# Altium footprint library SomoPowerPackControl.PcbLib: 145 footprints (part 7 of 10)
Each footprint in its own frame and in the unit in brackets; x right, y up, seen from the top. Pads: shape width x height; smd on the part's side, far side on the other; paste and mask are expansions set on the pad; w line width, h text height; cw(c..) or ccw(c..) is an arc to the next point about the centre after c.
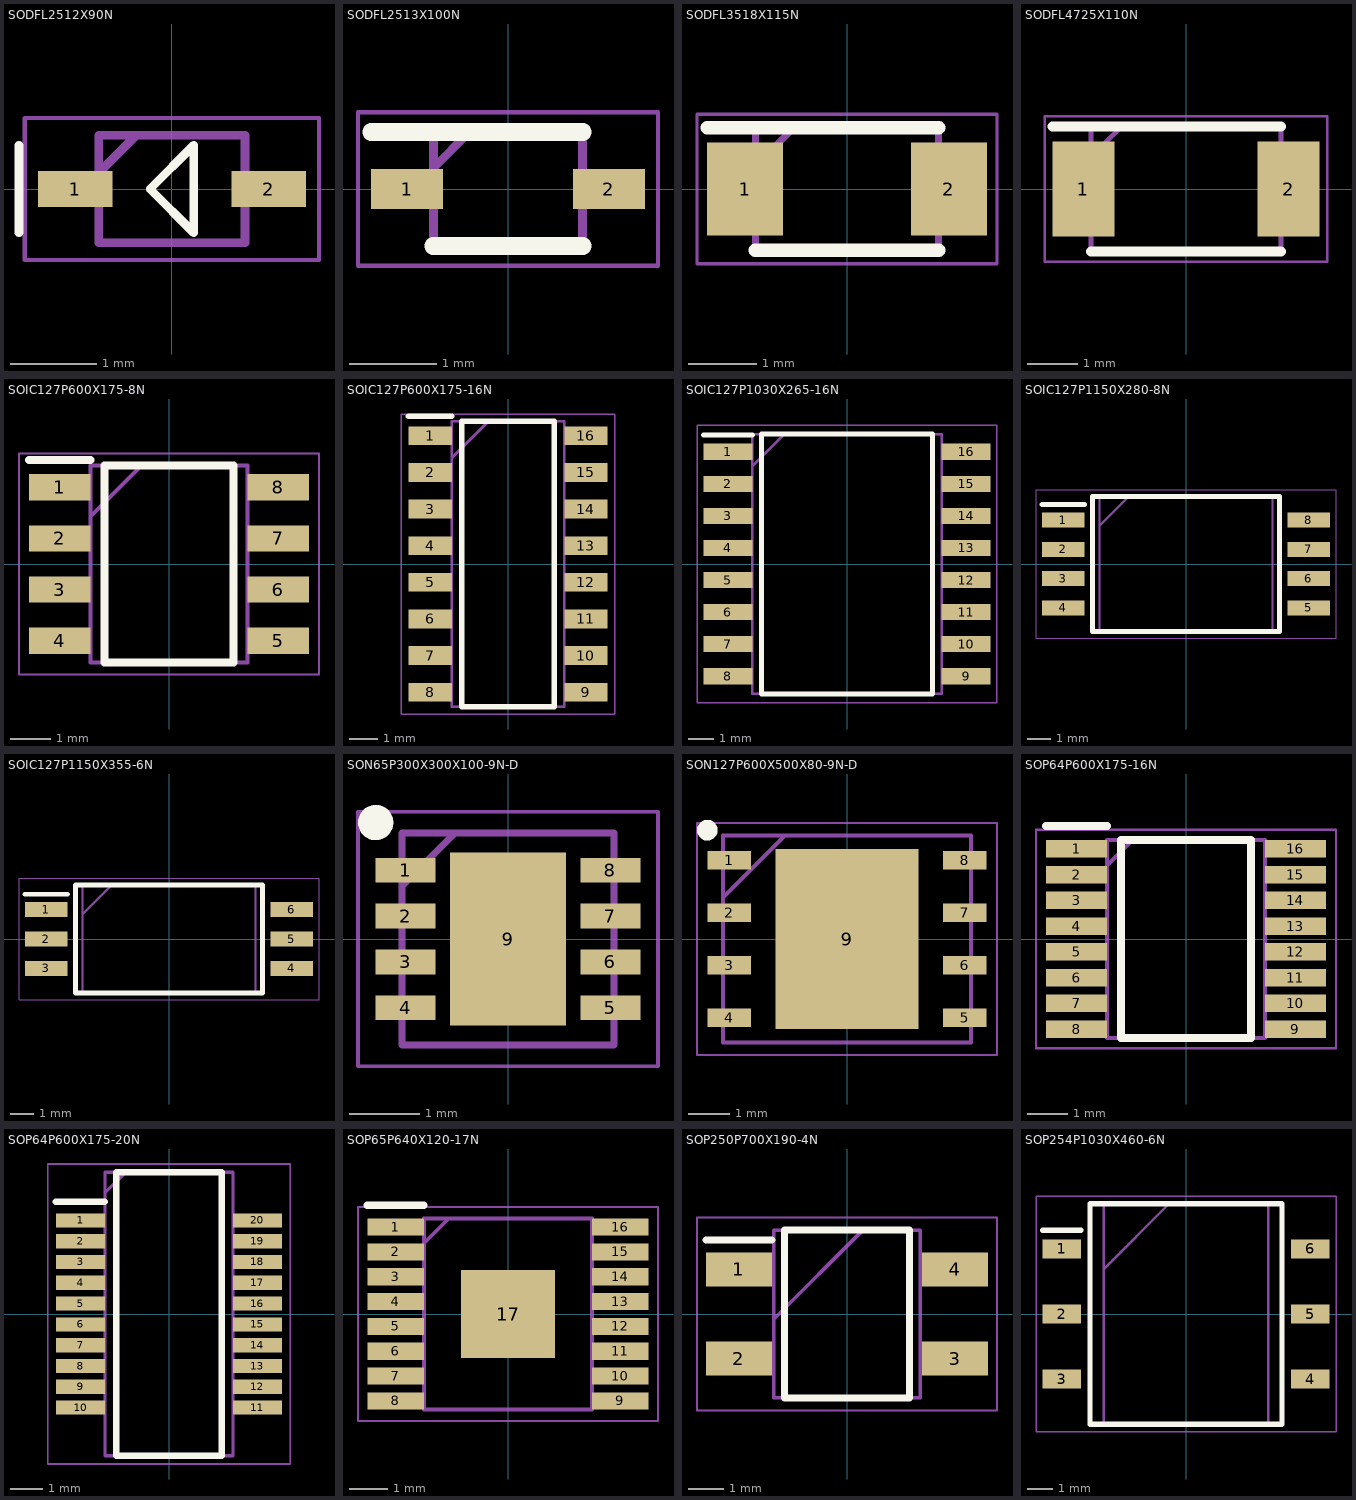
[diagram p6: the footprints below, top view; thin cyan lines are the x and y axes]

## SODFL2512X90N [mm]
pads (2):
  rect 0.87x0.42 smd: 1(-1.125,0) 2(1.125,0)
Top Overlay:
  lines w0.1: -1.778,-0.508 -1.778,0.508 ; -0.254,0 0.254,-0.508 0.254,0.508 -0.254,0
Mechanical 13:
  lines w0.1: -0.85,0.19 -0.415,0.625 ; -0.85,-0.625 0.85,-0.625 0.85,0.625 -0.85,0.625 -0.85,-0.625
Mechanical 15:
  lines w0.05: -1.71,-0.825 1.71,-0.825 1.71,0.825 -1.71,0.825 -1.71,-0.825
3D body "MM3Z12VB.stp": height 0.9, standoff 0, extent -1.25,-0.625 1.25,0.625

## SODFL2513X100N [mm]
pads (2):
  rect 0.82x0.46 smd: 1(-1.15,0) 2(1.15,0)
Top Overlay:
  lines w0.2: -1.56,0.65 0.85,0.65 ; -0.85,-0.65 0.85,-0.65
Mechanical 13:
  lines w0.1: -0.85,0.24 -0.44,0.65 ; -0.85,-0.65 0.85,-0.65 0.85,0.65 -0.85,0.65 -0.85,-0.65
Mechanical 15:
  lines w0.05: -1.71,-0.875 1.71,-0.875 1.71,0.875 -1.71,0.875 -1.71,-0.875
3D body "MM3Z15VC.stp": height 1, standoff 0, extent -1.25,-0.65 1.25,0.65

## SODFL3518X115N [mm]
pads (2):
  rect 1.12x1.37 smd: 1(-1.5,0) 2(1.5,0)
Top Overlay:
  lines w0.2: -2.06,0.9 1.35,0.9 ; -1.35,-0.9 1.35,-0.9
Mechanical 13:
  lines w0.1: -1.35,0.34 -0.79,0.9 ; -1.35,-0.9 1.35,-0.9 1.35,0.9 -1.35,0.9 -1.35,-0.9
Mechanical 15:
  lines w0.05: -2.21,-1.1 2.21,-1.1 2.21,1.1 -2.21,1.1 -2.21,-1.1
3D body "1N5819HW1-7-F.stp": height 1.15, standoff 0, extent -1.75,-0.9 1.75,0.9

## SODFL4725X110N [mm]
pads (2):
  rect 1.24x1.89 smd: 1(-2.05,0) 2(2.05,0)
Top Overlay:
  lines w0.2: -2.67,1.25 1.9,1.25 ; -1.9,-1.25 1.9,-1.25
Mechanical 13:
  lines w0.1: -1.9,0.63 -1.28,1.25 ; -1.9,-1.25 1.9,-1.25 1.9,1.25 -1.9,1.25 -1.9,-1.25
Mechanical 15:
  lines w0.05: -2.82,-1.45 2.82,-1.45 2.82,1.45 -2.82,1.45 -2.82,-1.45
3D body "GS1JAFC.stp": height 1.02, standoff 0, extent -2.349,-1.248 2.351,1.252

## SOIC127P600X175-8N [mm]
pads (8):
  rect 1.525x0.65 smd: 1(-2.712,1.905) 2(-2.712,0.635) 3(-2.712,-0.635) 4(-2.712,-1.905) 5(2.712,-1.905) 6(2.712,-0.635) 7(2.712,0.635) 8(2.712,1.905)
Top Overlay:
  lines w0.2: -3.475,2.58 -1.95,2.58 ; -1.6,-2.45 1.6,-2.45 1.6,2.45 -1.6,2.45 -1.6,-2.45
Mechanical 13:
  lines w0.1: -1.95,1.18 -0.68,2.45 ; -1.95,-2.45 1.95,-2.45 1.95,2.45 -1.95,2.45 -1.95,-2.45
Mechanical 15:
  lines w0.05: -3.725,-2.75 3.725,-2.75 3.725,2.75 -3.725,2.75 -3.725,-2.75
3D body "NE555DR.stp": height 1.75, standoff 0, extent -3,-2.45 3,2.45

## SOIC127P600X175-16N [mm]
pads (16):
  rect 1.5x0.65 smd: 1(-2.7,4.445) 2(-2.7,3.175) 3(-2.7,1.905) 4(-2.7,0.635) 5(-2.7,-0.635) 6(-2.7,-1.905) 7(-2.7,-3.175) 8(-2.7,-4.445) 9(2.7,-4.445) 10(2.7,-3.175) 11(2.7,-1.905) 12(2.7,-0.635) 13(2.7,0.635) 14(2.7,1.905) 15(2.7,3.175) 16(2.7,4.445)
Top Overlay:
  lines w0.2: -3.45,5.12 -1.95,5.12 ; -1.6,-4.95 1.6,-4.95 1.6,4.95 -1.6,4.95 -1.6,-4.95
Mechanical 13:
  lines w0.1: -1.95,3.68 -0.68,4.95 ; -1.95,-4.95 1.95,-4.95 1.95,4.95 -1.95,4.95 -1.95,-4.95
Mechanical 15:
  lines w0.05: -3.7,-5.2 3.7,-5.2 3.7,5.2 -3.7,5.2 -3.7,-5.2
3D body "Si8660BA-B-IS1.stp": height 1.75, standoff 0, extent -3,-4.95 3,4.95

## SOIC127P1030X265-16N [mm]
pads (16):
  rect 1.95x0.65 smd: 1(-4.725,4.445) 2(-4.725,3.175) 3(-4.725,1.905) 4(-4.725,0.635) 5(-4.725,-0.635) 6(-4.725,-1.905) 7(-4.725,-3.175) 8(-4.725,-4.445) 9(4.725,-4.445) 10(4.725,-3.175) 11(4.725,-1.905) 12(4.725,-0.635) 13(4.725,0.635) 14(4.725,1.905) 15(4.725,3.175) 16(4.725,4.445)
Top Overlay:
  lines w0.2: -5.7,5.12 -3.75,5.12 ; -3.4,-5.15 3.4,-5.15 3.4,5.15 -3.4,5.15 -3.4,-5.15
Mechanical 13:
  lines w0.1: -3.75,3.88 -2.48,5.15 ; -3.75,-5.15 3.75,-5.15 3.75,5.15 -3.75,5.15 -3.75,-5.15
Mechanical 15:
  lines w0.05: -5.95,-5.5 5.95,-5.5 5.95,5.5 -5.95,5.5 -5.95,-5.5
3D body "ISO1410BDWR.stp": height 2.59, standoff 0, extent -5.167,-5.15 5.167,5.15

## SOIC127P1150X280-8N [mm]
pads (8):
  rect 1.85x0.65 smd: 1(-5.325,1.905) 2(-5.325,0.635) 3(-5.325,-0.635) 4(-5.325,-1.905) 5(5.325,-1.905) 6(5.325,-0.635) 7(5.325,0.635) 8(5.325,1.905)
Top Overlay:
  lines w0.2: -6.25,2.58 -4.4,2.58 ; -4.05,-2.925 4.05,-2.925 4.05,2.925 -4.05,2.925 -4.05,-2.925
Mechanical 13:
  lines w0.1: -3.75,1.655 -2.48,2.925 ; -3.75,-2.925 3.75,-2.925 3.75,2.925 -3.75,2.925 -3.75,-2.925
Mechanical 15:
  lines w0.05: -6.5,-3.225 6.5,-3.225 6.5,3.225 -6.5,3.225 -6.5,-3.225
3D body "ISO1042BDWVR.stp": height 2.7, standoff 0, extent -5.768,-2.925 5.768,2.925

## SOIC127P1150X355-6N [mm]
pads (6):
  rect 1.85x0.65 smd: 1(-5.325,1.27) 2(-5.325,0) 3(-5.325,-1.27) 4(5.325,-1.27) 5(5.325,0) 6(5.325,1.27)
Top Overlay:
  lines w0.2: -6.25,1.945 -4.4,1.945 ; -4.05,-2.34 -4.05,2.34 4.05,2.34 4.05,-2.34 -4.05,-2.34
Mechanical 13:
  lines w0.1: -3.75,1.07 -2.48,2.34 ; -3.75,-2.34 -3.75,2.34 3.75,2.34 3.75,-2.34 -3.75,-2.34
Mechanical 15:
  lines w0.05: -6.5,-2.64 -6.5,2.64 6.5,2.64 6.5,-2.64 -6.5,-2.64

## SON65P300X300X100-9N-D [mm]
pads (9):
  rect 0.85x0.35 smd: 1(-1.45,0.975) 2(-1.45,0.325) 3(-1.45,-0.325) 4(-1.45,-0.975) 5(1.45,-0.975) 6(1.45,-0.325) 7(1.45,0.325) 8(1.45,0.975)
  rect 1.65x2.45 smd: 9(0,0)
Top Overlay:
  circle w0.25: c-1.875,1.65 r0.125
Mechanical 13:
  lines w0.1: -1.5,0.75 -0.75,1.5 ; -1.5,-1.5 -1.5,1.5 1.5,1.5 1.5,-1.5 -1.5,-1.5
Mechanical 15:
  lines w0.05: -2.125,-1.8 -2.125,1.8 2.125,1.8 2.125,-1.8 -2.125,-1.8
3D body "TJA1051TK_3_2Z.stp": height 1, standoff 0, extent -1.55,-1.5 1.55,1.5

## SON127P600X500X80-9N-D [mm]
pads (9):
  rect 1.05x0.45 smd: 1(-2.85,1.905) 2(-2.85,0.635) 3(-2.85,-0.635) 4(-2.85,-1.905) 5(2.85,-1.905) 6(2.85,-0.635) 7(2.85,0.635) 8(2.85,1.905)
  rect 3.45x4.35 smd: 9(0,0)
Top Overlay:
  circle w0.25: c-3.375,2.63 r0.125
Mechanical 13:
  lines w0.1: -3,1 -1.5,2.5 ; -3,-2.5 3,-2.5 3,2.5 -3,2.5 -3,-2.5
Mechanical 15:
  lines w0.05: -3.625,-2.8 3.625,-2.8 3.625,2.8 -3.625,2.8 -3.625,-2.8
3D body "W25Q32RVZPJM.stp": height 0.8, standoff 0, extent -3.05,-2.5 3.05,2.5

## SOP64P600X175-16N [mm]
pads (16):
  rect 1.5x0.435 smd: 1(-2.7,2.222) 2(-2.7,1.588) 3(-2.7,0.952) 4(-2.7,0.318) 5(-2.7,-0.318) 6(-2.7,-0.952) 7(-2.7,-1.588) 8(-2.7,-2.222) 9(2.7,-2.222) 10(2.7,-1.588) 11(2.7,-0.952) 12(2.7,-0.318) 13(2.7,0.318) 14(2.7,0.952) 15(2.7,1.588) 16(2.7,2.222)
Top Overlay:
  lines w0.2: -3.45,2.79 -1.95,2.79 ; -1.6,-2.445 1.6,-2.445 1.6,2.445 -1.6,2.445 -1.6,-2.445
Mechanical 13:
  lines w0.1: -1.95,1.81 -1.315,2.445 ; -1.95,-2.445 1.95,-2.445 1.95,2.445 -1.95,2.445 -1.95,-2.445
Mechanical 15:
  lines w0.05: -3.7,-2.695 3.7,-2.695 3.7,2.695 -3.7,2.695 -3.7,-2.695
3D body "SI8642BA-B-IUR.stp": height 1.75, standoff 0, extent -3,-2.445 3,2.445

## SOP64P600X175-20N [mm]
pads (20):
  rect 1.495x0.435 smd: 1(-2.702,2.858) 2(-2.702,2.222) 3(-2.702,1.588) 4(-2.702,0.952) 5(-2.702,0.318) 6(-2.702,-0.318) 7(-2.702,-0.952) 8(-2.702,-1.588) 9(-2.702,-2.222) 10(-2.702,-2.858) 11(2.702,-2.858) 12(2.702,-2.222) 13(2.702,-1.588) 14(2.702,-0.952) 15(2.702,-0.318) 16(2.702,0.318) 17(2.702,0.952) 18(2.702,1.588) 19(2.702,2.222) 20(2.702,2.858)
Top Overlay:
  lines w0.2: -3.45,3.425 -1.955,3.425 ; -1.605,-4.33 -1.605,4.33 1.605,4.33 1.605,-4.33 -1.605,-4.33
Mechanical 13:
  lines w0.1: -1.955,3.695 -1.32,4.33 ; -1.955,-4.33 -1.955,4.33 1.955,4.33 1.955,-4.33 -1.955,-4.33
Mechanical 15:
  lines w0.05: -3.7,-4.58 -3.7,4.58 3.7,4.58 3.7,-4.58 -3.7,-4.58
3D body "SI8380P-IUR.stp": height 1.75, standoff 0, extent -3,-4.33 3,4.33

## SOP65P640X120-17N [mm]
pads (17):
  rect 1.475x0.45 smd: 1(-2.938,2.275) 2(-2.938,1.625) 3(-2.938,0.975) 4(-2.938,0.325) 5(-2.938,-0.325) 6(-2.938,-0.975) 7(-2.938,-1.625) 8(-2.938,-2.275) 9(2.938,-2.275) 10(2.938,-1.625) 11(2.938,-0.975) 12(2.938,-0.325) 13(2.938,0.325) 14(2.938,0.975) 15(2.938,1.625) 16(2.938,2.275)
  rect 2.46x2.31 smd: 17(0,0)
Top Overlay:
  lines w0.2: -3.675,2.85 -2.2,2.85
Mechanical 13:
  lines w0.1: -2.2,1.85 -1.55,2.5 ; -2.2,-2.5 2.2,-2.5 2.2,2.5 -2.2,2.5 -2.2,-2.5
Mechanical 15:
  lines w0.05: -3.925,-2.8 3.925,-2.8 3.925,2.8 -3.925,2.8 -3.925,-2.8
3D body "DRV8876NPWPR.stp": height 1.13, standoff 0, extent -3.2,-2.5 3.2,2.5

## SOP250P700X190-4N [mm]
pads (4):
  rect 1.85x0.95 smd: 1(-3.025,1.25) 2(-3.025,-1.25) 3(3.025,-1.25) 4(3.025,1.25)
Top Overlay:
  lines w0.2: -3.95,2.075 -2.1,2.075 ; -1.75,-2.35 1.75,-2.35 1.75,2.35 -1.75,2.35 -1.75,-2.35
Mechanical 13:
  lines w0.1: -2.05,-0.15 0.45,2.35 ; -2.05,-2.35 2.05,-2.35 2.05,2.35 -2.05,2.35 -2.05,-2.35
Mechanical 15:
  lines w0.05: -4.2,-2.7 4.2,-2.7 4.2,2.7 -4.2,2.7 -4.2,-2.7
3D body "MB6S.stp": height 1.9, standoff 0, extent -3.5,-2.35 3.5,2.35

## SOP254P1030X460-6N [mm]
pads (6):
  rect 1.5x0.75 smd: 1(-4.85,2.54) 2(-4.85,0) 3(-4.85,-2.54) 4(4.85,-2.54) 5(4.85,0) 6(4.85,2.54)
Top Overlay:
  lines w0.2: -5.6,3.265 -4.1,3.265 ; -3.75,-4.3 3.75,-4.3 3.75,4.3 -3.75,4.3 -3.75,-4.3
Mechanical 13:
  lines w0.1: -3.2,1.76 -0.66,4.3 ; -3.2,-4.3 3.2,-4.3 3.2,4.3 -3.2,4.3 -3.2,-4.3
Mechanical 15:
  lines w0.05: -5.85,-4.6 5.85,-4.6 5.85,4.6 -5.85,4.6 -5.85,-4.6
3D body "H11AA1-X007T.stp": height 4.6, standoff 0, extent -5.15,-4.3 5.15,4.3